# Altium footprint library connector.PcbLib: 207 footprints (part 3 of 13)
Each footprint in its own frame and in the unit in brackets; x right, y up, seen from the top. Pads: shape width x height; smd on the part's side, far side on the other; paste and mask are expansions set on the pad; w line width, h text height; cw(c..) or ccw(c..) is an arc to the next point about the centre after c.
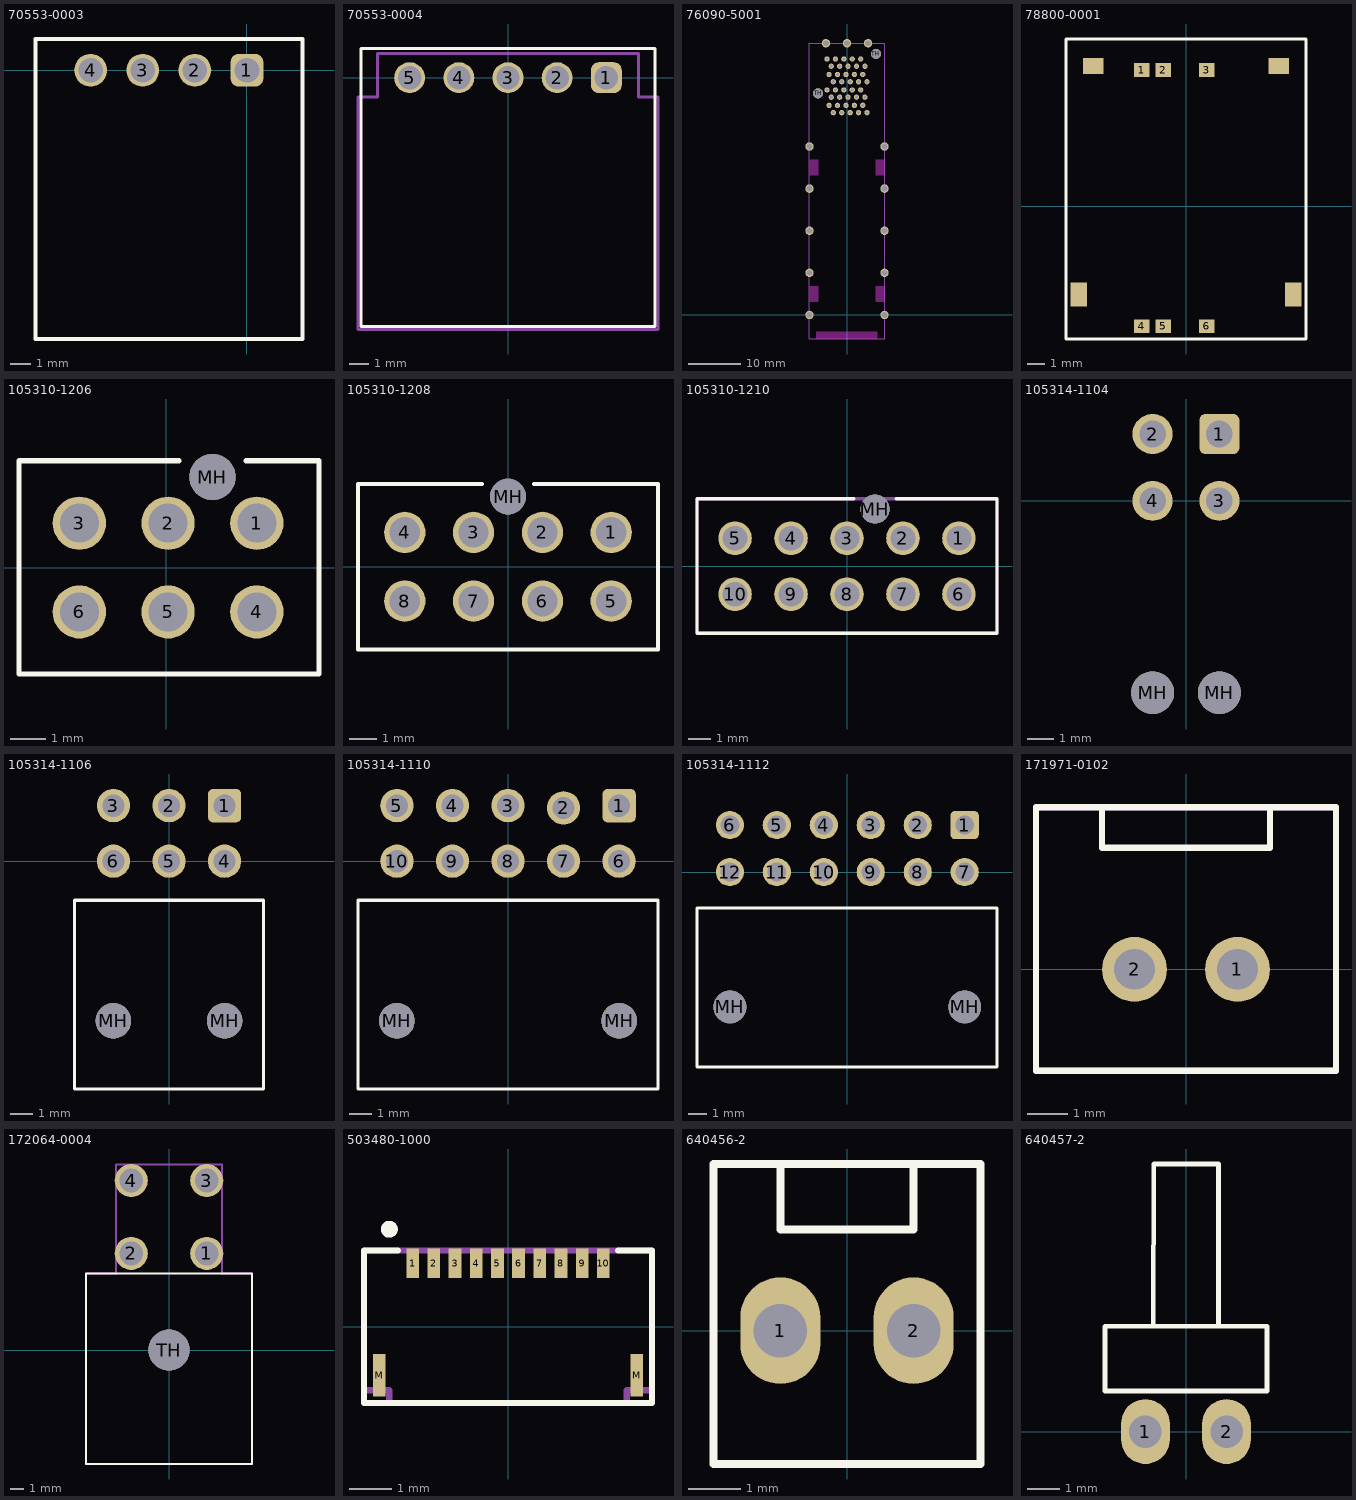
[diagram p2: the footprints below, top view; thin cyan lines are the x and y axes]

## 70553-0003 [mm] "Molex 2.54mm Pitch SLпїЅ Header, Low Profile, Single Row, Right Angle, 3.05mm Pocket, Shrouded, 4 Circuits, 0.38пїЅm Gold (Au) Selective Plating, Tin (Sn) PC Tail Plating"
pads (4):
  rrect50% 1.6x1.6 hole 1.2: 1(0,0)
  round 1.6 hole 1.2: 2(-2.54,0) 3(-5.08,0) 4(-7.62,0)
Top Overlay:
  lines w0.2: -10.3,-13.1 -10.3,1.524 2.7,1.524 2.7,-13.1 -10.3,-13.1
3D body "705530003.stp": height 6.98, standoff -3.3, extent -10.16,-12.89 2.54,0.699

## 70553-0004 [mm] "Molex, 2.54mm Pitch SLпїЅ Header, Low Profile, Single Row, Right Angle, 3.05mm Pocket, Shrouded, 5 Circuits, 0.38пїЅm Gold (Au) Selective Plating, Tin (Sn) PC Tail Plating"
pads (5):
  rrect50% 1.6x1.6 hole 1.2: 1(5.08,0)
  round 1.6 hole 1.2: 2(2.54,0) 3(0,0) 4(-2.54,0) 5(-5.08,0)
Top Overlay:
  lines w0.15: -7.6,-12.86 7.6,-12.86 7.6,1.5 -7.6,1.5 -7.6,-12.86
Top Courtyard:
  lines w0.15: -7.75,-13 -7.75,-1 -6.75,-1 -6.75,1.25 6.75,1.25 6.75,-1 7.75,-1 7.75,-13 -0.17,-13 -7.75,-13
3D body "705530004.stp": height 6.98, standoff -3.3, extent -7.62,-12.89 7.62,0.699

## 76090-5001 [mm] "Small Form-factor Pluggable Plus (SFP+) Stacked 2-by-1 Multi-Port Connector with 4 Lightpipe Ports, Elastomeric Gasket, 40 Circuits, Tin (Sn) Tails"
height 26
pads (55):
  round 1 hole 0.6: L1(3.4,41.37) L2(2.6,42.75) L3(1.8,41.37) L4(1,42.75) L5(0.2,41.37) L6(-0.6,42.75) L7(-1.4,41.37) L8(-2.2,42.75) L9(-3,41.37) L10(-3.8,42.75) L11(-3.4,39.82) L12(-2.6,38.43) L13(-1.8,39.82) L14(-1,38.43) L15(-0.2,39.82) L16(0.6,38.43) L17(1.4,39.82) L18(2.2,38.43) L19(3,39.82) L20(3.8,38.43) T1(-3.4,45.69) T2(-2.6,44.3) T3(-1.8,45.69) T4(-1,44.3) T5(-0.2,45.69) T6(0.6,44.3) T7(1.4,45.69) T8(2.2,44.3) T9(3,45.69) T10(3.8,44.3) T11(3.4,47.24) T12(2.6,48.62) T13(1.8,47.24) T14(1,48.62) T15(0.2,47.24) T16(-0.6,48.62) T17(-1.4,47.24) T18(-2.2,48.62) T19(-3,47.24) T20(-3.8,48.62)
  round 1.6 hole 1.1: TH(-7.125,0) TH(-7.125,8) TH(-7.125,16) TH(-7.125,24) TH(-7.125,32) TH(-4,51.625) TH(0,51.625) TH(4,51.625) TH(7.125,0) TH(7.125,8) TH(7.125,16) TH(7.125,24) TH(7.125,32)
  round 1.9 hole 1.9: TH(-5.5,42.1) TH(5.5,49.6)
Keep-Out Layer:
  region: 7.125,5.5 5.375,5.5 5.375,2.5 7.125,2.5
  region: 7.125,29.5 5.375,29.5 5.375,26.5 7.125,26.5
  rectangle: -7.125,26.5 -5.375,29.5
  rectangle: -7.125,2.5 -5.375,5.5
  rectangle: -5.855,-4.572 5.829,-3.175
Mechanical 29:
  lines w0.15: -7.125,-4.5 -7.125,51.625 7.125,51.625 7.125,-4.5 -7.125,-4.5
  text ".Designator" at -3,25.7 h1
3D body "760905001.stp": height 28.15, standoff -3.32, extent -9.75,-11.5 9.75,51.75

## 78800-0001 [mm] "Molex, 1.50mm Height Hinged-style micro-SIM Card Socket without Detect Switch, Surface Mount, 6 Circuits, Low-Halogen, Lead-Free"
height 1.5
pads (10):
  rect 0.9x0.8 smd: 1(-2.57,7.94) 2(-1.33,7.94) 3(1.21,7.94) 4(-2.57,-7) 5(-1.33,-7) 6(1.21,-7)
  rect 0.95x1.4 smd: ""(-6.26,-5.14) ""(6.26,-5.14)
  rect 1.2x0.95 smd: ""(-5.42,8.17) ""(5.42,8.17)
Top Overlay:
  lines w0.2: -7,-7.75 7,-7.75 7,9.75 -7,9.75 -7,-7.75
3D body "788000001.stp": height 1.48, standoff -0.02, extent -6.92,-7.3 6.93,9.66

## 105310-1206 [mm]
pads (7):
  round 1.5 hole 1.1: 1(2.55,1.25) 2(0.05,1.25) 3(-2.45,1.25) 4(2.55,-1.25) 5(0.05,-1.25) 6(-2.45,-1.25)
  round 1.3 hole 1.3 unplated: MH(1.3,2.55)
Top Overlay:
  lines w0.15: 0.35,3.01 -4.15,3.01 -4.15,-3 4.3,-3 4.3,3.01 2.25,3.01
  text "." at 3,3.5 h0.1
3D body "1053101206.stp": height 10.68, standoff -3.03, extent -4.17,-2.99 4.27,5.85

## 105310-1208 [mm]
pads (9):
  round 1.5 hole 1.1: 1(3.75,1.25) 2(1.25,1.25) 3(-1.25,1.25) 4(-3.75,1.25) 5(3.75,-1.25) 6(1.25,-1.25) 7(-1.25,-1.25) 8(-3.75,-1.25)
  round 1.3 hole 1.3 unplated: MH(0,2.55)
Top Overlay:
  lines w0.15: -0.95,3.01 -5.45,3.01 -5.45,-3 5.45,-3 5.45,3.01 0.95,3.01
  text "." at 4.5,3.5 h0.1
3D body "1053101208.stp": height 10.68, standoff -3.03, extent -5.47,-2.99 5.47,5.85

## 105310-1210 [mm]
pads (11):
  round 1.5 hole 1.1: 1(5,1.25) 2(2.5,1.25) 3(0,1.25) 4(-2.5,1.25) 5(-5,1.25) 6(5,-1.25) 7(2.5,-1.25) 8(0,-1.25) 9(-2.5,-1.25) 10(-5,-1.25)
  round 1.3 hole 1.3 unplated: MH(1.25,2.55)
Top Overlay:
  lines w0.15: 0.3,3.01 -6.7,3.01 -6.7,-3 6.7,-3 6.7,3.01 2.2,3.01
  text "." at 5.53,3.5 h0.1
Top Courtyard:
  lines w0.15: -6.7,-3 0,-3 6.7,-3 6.7,3.01 -6.7,3.01 -6.7,-3
3D body "1053101110.stp": height 10.68, standoff -3.03, extent -6.72,-2.99 6.72,5.85

## 105314-1104 [mm]
height 9.2
pads (6):
  rrect30% 1.5x1.5 hole 1: 1(1.25,2.5)
  round 1.5 hole 1: 2(-1.25,2.5) 3(1.25,0) 4(-1.25,0)
  round 1.6 hole 1.6 unplated: MH(-1.25,-7.18) MH(1.25,-7.18)
3D body "1053141104.stp": height 9.15, standoff -3.19, extent -2.97,-11.84 2.97,2.818

## 105314-1106 [mm]
height 9.2
pads (8):
  rrect30% 1.5x1.5 hole 1: 1(2.5,2.5)
  round 1.5 hole 1: 2(0,2.5) 3(-2.5,2.5) 4(2.5,0) 5(0,0) 6(-2.5,0)
  round 1.6 hole 1.6 unplated: MH(-2.5,-7.18) MH(2.5,-7.18)
Top Overlay:
  lines w0.15: -4.25,-10.25 -4.25,-1.75 4.25,-1.75 4.25,-10.25 -4.25,-10.25
3D body "1053141406.stp": height 9.15, standoff -3.19, extent -4.22,-11.84 4.22,2.818

## 105314-1110 [mm]
height 9.2
pads (12):
  rrect30% 1.5x1.5 hole 1: 1(5,2.5)
  round 1.5 hole 1: 2(2.5,2.4) 3(0,2.5) 4(-2.5,2.5) 5(-5,2.5) 6(5,0) 7(2.5,0) 8(0,0) 9(-2.5,0) 10(-5,0)
  round 1.6 hole 1.6 unplated: MH(-5,-7.18) MH(5,-7.18)
Top Overlay:
  lines w0.15: -6.75,-10.25 6.75,-10.25 6.75,-1.75 -6.75,-1.75 -6.75,-10.25
3D body "1053141110.stp": height 9.15, standoff -3.19, extent -6.72,-11.89 6.72,2.768

## 105314-1112 [mm]
pads (14):
  rrect30% 1.5x1.5 hole 1: 1(6.25,2.5)
  round 1.5 hole 1: 2(3.75,2.5) 3(1.25,2.5) 4(-1.25,2.5) 5(-3.75,2.5) 6(-6.25,2.5) 7(6.25,0) 8(3.75,0) 9(1.25,0) 10(-1.25,0) 11(-3.75,0) 12(-6.25,0)
  round 1.75 hole 1.75 unplated: MH(-6.25,-7.18) MH(6.25,-7.18)
Top Overlay:
  lines w0.15: -8,-10.38 -8,-1.92 7.97,-1.92 7.97,-10.38 -8,-10.38
3D body "1053141112.stp": height 9.35, standoff -2.99, extent -7.97,-11.89 7.97,2.768

## 171971-0102 [mm]
height 12
pads (2):
  round 1.6 hole 1: 1(1.27,0) 2(-1.27,0)
Top Overlay:
  lines w0.15: -1.011,4 -2.07,4 -2.07,3 0,3 2.07,3 2.07,4 ; -3.7,-2.5 3.7,-2.5 3.7,4 -3.7,4 -3.7,-2.5
Top Courtyard:
  lines w0.15: -3.7,-2.5 -3.7,4 3.7,4 3.7,-2.5 -3.7,-2.5
3D body "1719710002.stp": height 11.8, standoff -3.31, extent -3.69,-2.55 3.69,4.05

## 172064-0004 [mm] "172064-0004 & 76825-0004"
height 15
pads (5):
  round 2.5 hole 1.8: 1(2.85,7.3) 2(-2.85,7.3) 3(2.85,12.8) 4(-2.85,12.8)
  round 3.1 hole 3.1 unplated: TH(0,0)
Top Overlay:
  lines w0.15: -6.25,-8.6 6.25,-8.6 6.25,5.775 -0.575,5.775 -6.25,5.775 -6.25,-8.6
Top Courtyard:
  lines w0.15: -6.25,-8.6 6.25,-8.6 6.25,5.775 4,5.775 4,14 -4,14 -4,5.775 -6.25,5.775 -6.25,-8.6
3D body "172064-0004.stp": height 14.62, standoff -3.52, extent -6.03,-8.587 6.03,13.375

## 503480-1000 [mm]
height 1
pads (12):
  rect 0.3x0.7 smd: 1(-2.25,1.5) 2(-1.75,1.5) 3(-1.25,1.5) 4(-0.75,1.5) 5(-0.25,1.5) 6(0.25,1.5) 7(0.75,1.5) 8(1.25,1.5) 9(1.75,1.5) 10(2.25,1.5)
  rect 0.3x1 smd: M(-3.04,-1.15) M(3.04,-1.15)
Top Overlay:
  circle w0.2: c-2.8,2.3 r0.1
  lines w0.15: -2.6,1.8 -3.4,1.8 -3.4,-1.801 0,-1.801 3.4,-1.801 3.4,1.8 2.6,1.8
Top Courtyard:
  lines w0.15: -3.4,-1.5 -3.4,1.8 3.4,1.8 3.4,-1.5 2.8,-1.5 2.8,-1.8 -2.8,-1.8 -2.8,-1.5 -3.4,-1.5
3D body "5034801000.stp": height 1.88, standoff -0.02, extent -3.35,-1.82 3.35,1.78

## 640456-2 [mil]
pads (2):
  oval 60x80 hole 40: 1(-50,0) 2(50,0)
Top Overlay:
  lines w5.91: -50,125 -50,75.97 50,75.97 50,125 ; -100,-100 100,-100 100,125 -100,125 -100,-100
3D body "User Library-640456-2.step": height 395, standoff -140, extent -100,-105 100,125

## 640457-2 [mil]
pads (2):
  oval 60x80 hole 40: 1(-50,0) 2(50,0)
Top Overlay:
  lines w5.91: -40.41,130 -39.67,330 40,330 40,130 ; -100,50 100,50 100,130 -100,130 -100,50
3D body: height 135, standoff -118.11, extent -60,-9.99 -40,10.01
3D body: height 135, standoff -118.11, extent 40,-10 60,10
3D body: height 135, standoff 115, extent 40,-10 60,430
3D body: height 135, standoff 115, extent -60,-10 -40,430
3D body: height 225, standoff 180, extent -40,130 40,330
3D body: height 225, standoff 0, extent -100,50 100,130